# Altium footprint library DrPCB.PcbLib: 910 footprints (part 12 of 57)
Each footprint in its own frame and in the unit in brackets; x right, y up, seen from the top. Pads: shape width x height; smd on the part's side, far side on the other; paste and mask are expansions set on the pad; w line width, h text height; cw(c..) or ccw(c..) is an arc to the next point about the centre after c.
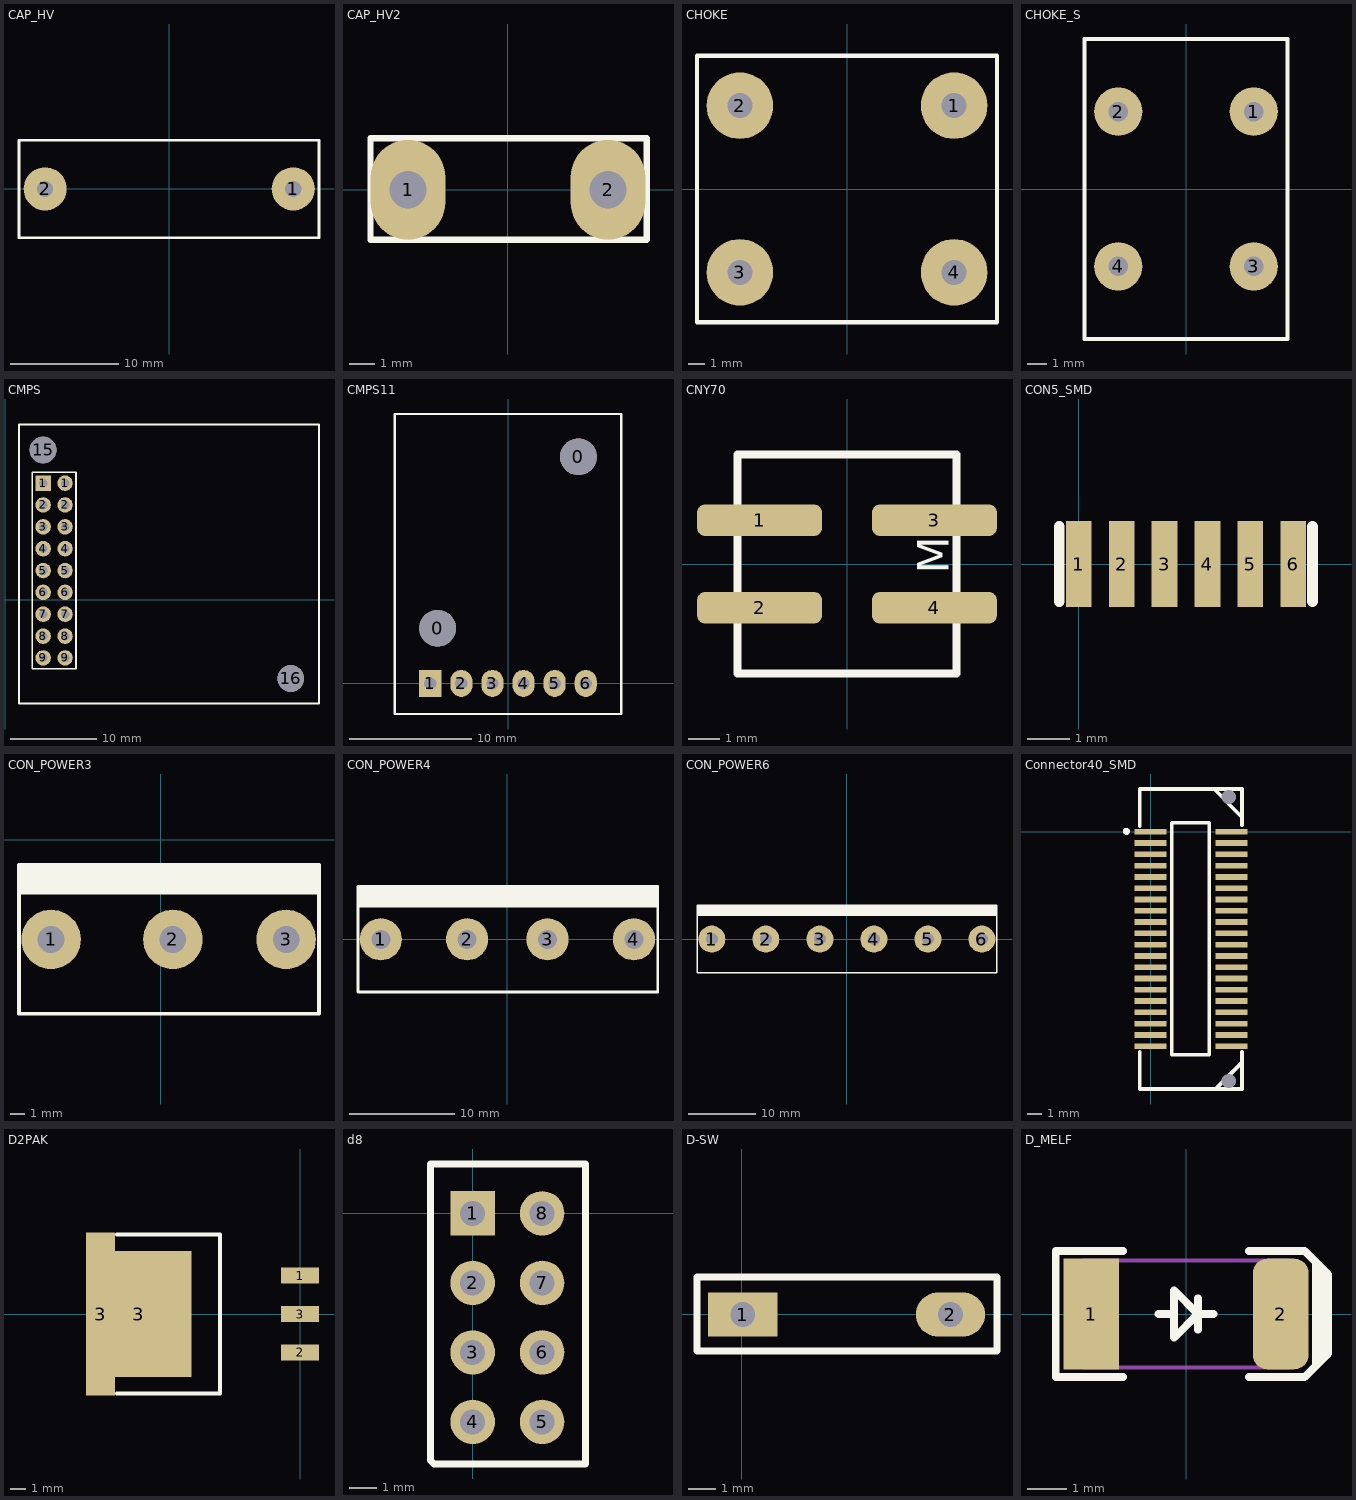
[diagram p11: the footprints below, top view; thin cyan lines are the x and y axes]

## CAP_HV [mm]
pads (2):
  round 4 hole 1.5: 1(11.5,0) 2(-11.5,0)
Top Overlay:
  lines w0.254: -13.924,-4.517 13.889,-4.517 13.889,4.5 -13.924,4.5 -13.924,-4.517

## CAP_HV2 [mm]
pads (2):
  oval 3x4 hole 1.5: 1(-4,0) 2(4,0)
Top Overlay:
  lines w0.254: -5.5,2 -5.5,-2 5.5,-2 ; -5.5,2.064 5.549,2.064 5.549,-2

## CHOKE [mm]
pads (4):
  round 4 hole 1.5: 1(6.425,5) 2(-6.425,5) 3(-6.425,-5) 4(6.425,-5)
Top Overlay:
  lines w0.254: -9,-8 9,-8 9,8 -9,8 -9,-8

## CHOKE_S [mm]
pads (4):
  round 2.5 hole 1: 1(3.5,4) 2(-3.5,4) 3(3.5,-4) 4(-3.5,-4)
Top Overlay:
  lines w0.2: -5.25,-7.75 -5.25,7.75 5.25,7.75 5.25,-7.75 -5.25,-7.75

## CMPS [mm]
pads (20):
  rect 1.8x1.8 hole 1: 1(4.411,13.548)
  round 1.8 hole 1: 1(6.951,13.548) 2(4.411,11.008) 2(6.951,11.008) 3(4.411,8.468) 3(6.951,8.468) 4(4.411,5.928) 4(6.951,5.928) 5(4.411,3.388) 5(6.951,3.388) 6(4.411,0.848) 6(6.951,0.848) 7(4.411,-1.692) 7(6.951,-1.692) 8(4.411,-4.232) 8(6.951,-4.232) 9(4.411,-6.772) 9(6.951,-6.772)
  round 3.1 hole 3.1: 15(4.389,17.4) 16(33.197,-9.16)
Top Overlay:
  lines w0.2: 3.141,-8.042 3.141,14.818 8.221,14.818 8.221,-8.042 3.141,-8.042
  lines w0.254: 1.595,-12.077 36.469,-12.077 36.469,20.371 1.595,20.371 1.595,-12.077

## CMPS11 [mm]
pads (8):
  round 3 hole 3: 0(-5.75,4.5) 0(5.75,18.5)
  rect 1.8x2.2 hole 1: 1(-6.35,0)
  oval 1.8x2.2 hole 1: 2(-3.81,0) 3(-1.27,0) 4(1.27,0) 5(3.81,0) 6(6.35,0)
Top Overlay:
  lines w0.2: -9.25,-2.5 -9.25,22 9.25,22 9.25,-2.5 -9.25,-2.5

## CNY70 [mm]
pads (4):
  rrect50% 4x1 smd: 1(-2.794,1.4) 2(-2.794,-1.397) 3(2.794,1.4) 4(2.794,-1.397)
Top Overlay:
  lines w0.254: -3.5,-3.5 3.5,-3.5 3.5,3.5 -3.5,3.5 -3.5,-3.5
  text "M" at 3.251,-0.318 h1

## CON5_SMD [mm]
pads (6):
  rect 0.6x2 smd: 1(0,0) 2(1,0) 3(2,0) 4(3,0) 5(4,0) 6(5,0)
Top Overlay:
  lines w0.254: -0.457,-0.876 -0.457,0.876 ; 5.448,-0.876 5.448,0.876

## CON_POWER3 [mm]
pads (3):
  round 4 hole 1.8: 1(-7.377,-6.706) 2(0.813,-6.706) 3(8.433,-6.706)
Top Overlay:
  rectangle: -9.538,-3.683 10.554,-1.651
  lines w0.254: -9.538,-11.706 10.643,-11.706 10.643,-1.706 -9.538,-1.706 -9.538,-11.706

## CON_POWER4 [mm]
pads (4):
  round 4 hole 1.8: 1(-12,0) 2(-3.81,0) 3(3.81,0) 4(12,0)
Top Overlay:
  rectangle: -14.16,3.023 14.287,5.055
  lines w0.254: -14.16,-5 14.262,-5 14.262,5 -14.16,5 -14.16,-5

## CON_POWER6 [mm]
pads (6):
  round 4 hole 1.8: 1(-20,0) 2(-12,0) 3(-4,0) 4(4,0) 5(12,0) 6(20,0)
Top Overlay:
  rectangle: -22.2,3.429 22.238,5.029
  lines w0.254: -22.149,-5 22.2,-5 22.2,5 -22.149,5 -22.149,-5

## Connector40_SMD [mil]
pads (42):
  rect 89.49x15.98 smd: 1(-0.95,0.1) 2(224.56,0.1) 3(-0.95,-31.39) 4(224.56,-31.39) 5(-0.95,-62.89) 6(224.56,-62.89) 7(-0.95,-94.38) 8(224.56,-94.38) 9(-0.95,-125.88) 10(224.56,-125.88) 11(-0.95,-157.37) 12(224.56,-157.37) 13(-0.95,-188.87) 14(224.56,-188.87) 15(-0.95,-220.37) 16(224.56,-220.37) 17(-0.95,-251.86) 18(224.56,-251.86) 19(-0.95,-283.36) 20(224.56,-283.36) 21(-0.95,-314.85) 22(224.56,-314.85) 23(-0.95,-346.35) 24(224.56,-346.35) 25(-0.95,-377.85) 26(224.56,-377.85) 27(-0.95,-409.34) 28(224.56,-409.34) 29(-0.95,-440.84) 30(224.56,-440.84) 31(-0.95,-472.33) 32(224.56,-472.33) 33(-0.95,-503.83) 34(224.56,-503.83) 35(-0.95,-535.33) 36(224.56,-535.33) 37(-0.95,-566.82) 38(224.56,-566.82) 39(-0.95,-598.32) 40(224.56,-598.32)
  rect 0x0 hole 40 unplated: C(216.93,-695.33) C(216.93,97.11)
Top Overlay:
  circle w9.84: c-68.31,1.29 r4.92
  lines w10: -30.67,-614.07 -30.67,-717.81 254.29,-717.81 254.29,-614.07 ; -30.67,15.85 -30.67,119.59 254.29,119.59 254.29,18.81 ; 176.77,119.59 254.29,40.85 ; 184.52,-713.75 254.29,-643.99 ; 58.66,-621.94 58.66,25.7 162.99,25.7 162.99,-621.94 58.66,-621.94
Mechanical 13:
  lines w10: -30.67,-717.81 254.29,-717.81 ; -30.67,119.59 254.29,119.59

## D2PAK [mm]
pads (5):
  rect 2.5x1.07 smd: 1(0,2.54) 2(0,-2.54) 3(0,0)
  rect 1.91x10.8 smd: 3(-13.215,0)
  rect 6.99x8.33 smd: 3(-10.675,0)
Top Overlay:
  lines w0.254: -12.128,-5.271 -5.296,-5.271 ; -12.128,5.271 -5.296,5.271 -5.296,-5.245
3D body "User Library-Part Studio 1.STEP": height 4.57, standoff 0, extent -13.672,-5.08 0.667,5.08

## d8 [mm]
pads (8):
  rect 1.6x1.6 hole 0.9: 1(0,0)
  round 1.6 hole 0.9: 2(0,-2.5) 3(0,-5) 4(0,-7.5) 5(2.5,-7.5) 6(2.5,-5) 7(2.5,-2.5) 8(2.5,0)
Top Overlay:
  lines w0.254: -1.524,-8.89 -1.397,-9.017 4.064,-9.017 4.064,1.778 -1.524,1.778 -1.524,-8.89

## D-SW [mm]
pads (2):
  rect 2.5x1.6 hole 0.9: 1(0.037,-0.008)
  oval 2.5x1.6 hole 0.9: 2(7.537,-0.008)
Top Overlay:
  lines w0.254: -1.614,-1.329 9.219,-1.329 9.219,1.351 -1.614,1.351 -1.614,-1.329

## D_MELF [mm] "MELF Diode, 2-Leads, Body 5.0X2.5mm"
height 2.7
pads (2):
  rect 1.4x2.8 smd paste-0.2 mask+0.1: 1(-2.4,0)
  rrect50% 1.4x2.8 smd paste-0.2 mask+0.1: 2(2.4,0)
Top Overlay:
  region: 3.2,1.4 3.2,-1.4 3.6,-1 3.6,1
  lines w0.2: -1.6,-1.6 -3.3,-1.6 -3.3,1.6 -1.6,1.6 ; -0.7,0 -0.3,0 ; 0.3,-0.4 0.3,0.4 ; 0.7,0 0.3,0 ; 1.6,-1.6 3,-1.6 3.6,-1 3.6,1 3,1.6 1.6,1.6 ; 0.3,0 -0.3,0.6 -0.3,-0.6 0.3,0
Mechanical 13:
  rectangle: 1.901,-1.35 2.6,1.35
  lines w0.1: -2.6,-1.35 2.6,-1.35 2.6,1.35 -2.6,1.35 -2.6,-1.35
3D body "User Library-Diode MELF5025.step": height 2.5, standoff 0, extent -2.5,-1.25 2.5,1.25